# Altium footprint library Dip Switch.PcbLib: 39 footprints (part 2 of 3)
Each footprint in its own frame and in the unit in brackets; x right, y up, seen from the top. Pads: shape width x height; smd on the part's side, far side on the other; paste and mask are expansions set on the pad; w line width, h text height; cw(c..) or ccw(c..) is an arc to the next point about the centre after c.
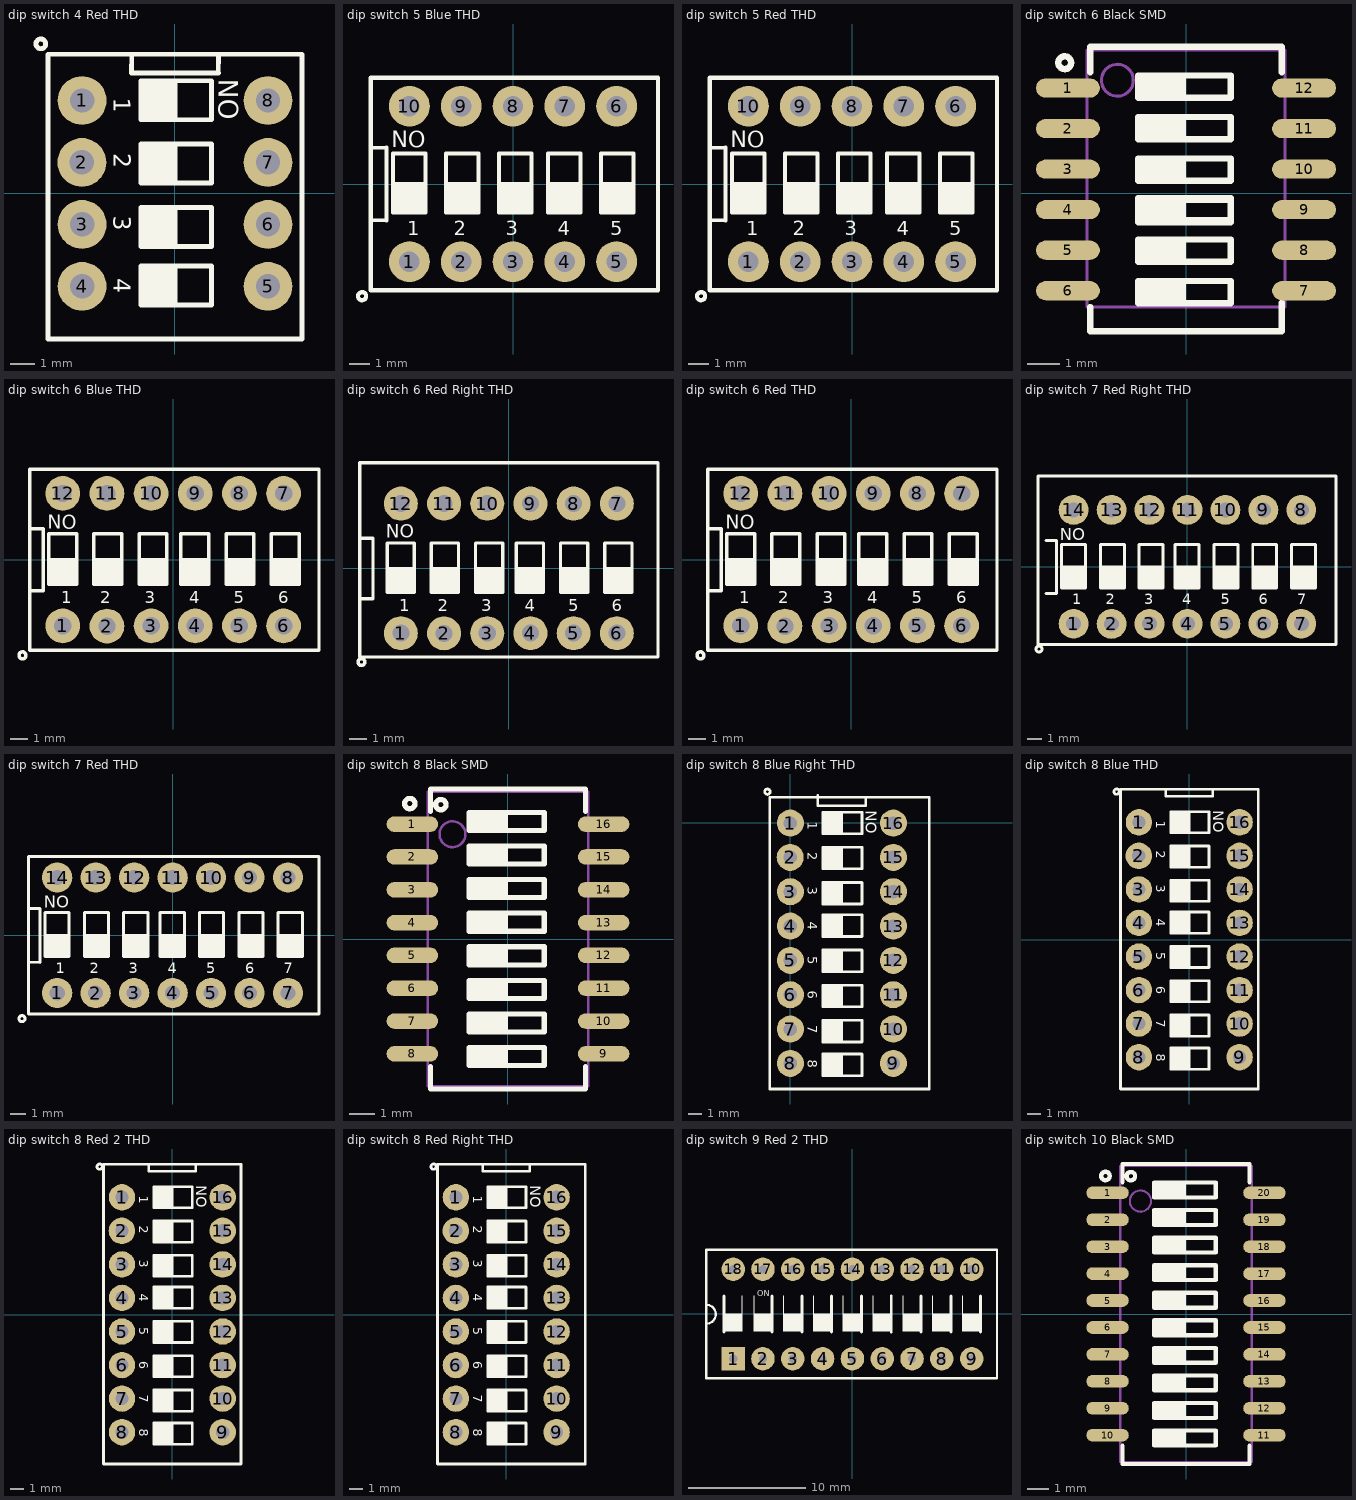
[diagram p1: the footprints below, top view; thin cyan lines are the x and y axes]

## dip switch 4 Red THD [mm]
height 6.5
pads (8):
  round 2 / inner round 1.4 / far side round 2 hole 1: 1(-3.805,3.81) 2(-3.815,1.27) 3(-3.805,-1.27) 4(-3.805,-3.81) 5(3.815,-3.81) 6(3.815,-1.27) 7(3.815,1.27) 8(3.815,3.81)
Top Overlay:
  circle w0.2: c-5.5,6.13 r0.2
  rectangle: -1.4,3.02 0.1,4.62
  rectangle: -1.4,0.42 0.1,2.02
  rectangle: -1.4,-2.18 0.1,-0.58
  rectangle: -1.4,-4.58 0.1,-2.98
  lines w0.2: -1.782,4.942 -1.773,5.656 ; -1.773,4.942 1.783,4.942 ; 1.774,4.942 1.783,5.656 ; -5.207,-5.969 5.212,-5.969 5.212,5.704 -5.207,5.704 -5.207,-5.969 ; -1.4,-4.58 -1.4,-2.98 1.5,-2.98 1.5,-4.58 -1.4,-4.58 ; -1.4,-2.18 -1.4,-0.58 1.5,-0.58 1.5,-2.18 -1.4,-2.18 ; -1.4,0.42 -1.4,2.02 1.5,2.02 1.5,0.42 -1.4,0.42 ; -1.4,3.02 -1.4,4.62 1.5,4.62 1.5,3.02 -1.4,3.02
  text "ON" at 2.6,3.02 h0.8
  text "1" at -2.51,3.911 h0.7
  text "2" at -2.51,1.647 h0.7
  text "3" at -2.51,-0.913 h0.7
  text "4" at -2.51,-3.474 h0.7
Mechanical 1:
  circle w0.025: c3.816,3.817 r0.254
  circle w0.025: c3.816,1.277 r0.254
  circle w0.025: c3.816,-1.263 r0.254
  circle w0.025: c3.816,-3.803 r0.254
  circle w0.025: c-3.804,-3.803 r0.254
  circle w0.025: c-3.804,-1.263 r0.254
  circle w0.025: c-3.814,1.277 r0.254
  circle w0.025: c-3.804,3.817 r0.254
3D body: height 6.35, standoff 0.25, extent -1.441,0.515 -0.73,2.039
3D body: height 5.08, standoff 0.25, extent -0.73,0.515 1.449,2.039
3D body: height 5.59, standoff 0, extent -1.441,-0.501 1.449,0.515
3D body: height 5.59, standoff 0, extent -1.441,-3.041 1.449,-2.025
3D body: height 5.59, standoff 0, extent -1.441,2.039 1.449,3.055
3D body: height 5.59, standoff 0, extent -1.441,4.579 1.449,5.29
3D body: height 6.35, standoff 0.25, extent -1.441,-4.565 -0.73,-3.041
3D body: height 5.08, standoff 0.25, extent -0.73,-4.565 1.449,-3.041
3D body: height 6.35, standoff 0.25, extent -1.441,-2.025 -0.73,-0.501
3D body: height 5.08, standoff 0.25, extent -0.73,-2.025 1.449,-0.501
3D body: height 5.08, standoff 0.25, extent -0.73,3.055 1.449,4.579
3D body: height 5.59, standoff 0, extent -4.947,-5.835 4.959,5.798
3D body: height 3.81, standoff 0, extent -1.904,5.29 1.906,5.798
3D body: height 0.76, standoff 0, extent -4.057,-4.057 -3.55,-3.55
3D body: height 0.76, standoff 0, extent -4.057,-1.517 -3.55,-1.01
3D body: height 0.76, standoff 0, extent -4.067,1.023 -3.56,1.53
3D body: height 0.76, standoff 0, extent -4.057,3.563 -3.55,4.07
3D body: height 0.76, standoff 0, extent 3.563,-4.057 4.07,-3.55
3D body: height 0.76, standoff 0, extent 3.563,-1.517 4.07,-1.01
3D body: height 0.76, standoff 0, extent 3.563,1.023 4.07,1.53
3D body: height 0.76, standoff 0, extent 3.563,3.563 4.07,4.07
3D body: height 6.35, standoff 0.25, extent -1.441,3.055 -0.73,4.579
3D body: height 0.25, standoff 0.05, extent -4.947,-5.835 4.959,5.798

## dip switch 5 Blue THD [mm]
height 6.5
pads (10):
  round 2 / inner round 1.4 / far side round 2 hole 1: 1(-5.08,-3.805) 2(-2.54,-3.815) 3(0,-3.805) 4(2.54,-3.805) 5(5.08,-3.805) 6(5.08,3.815) 7(2.54,3.815) 8(0,3.815) 9(-2.54,3.815) 10(-5.08,3.815)
Top Overlay:
  circle w0.2: c-7.4,-5.5 r0.2
  region: -4.29,-1.4 -4.29,0.1 -5.89,0.1 -5.89,-1.4
  region: -1.69,-1.4 -1.69,0.1 -3.29,0.1 -3.29,-1.4
  region: 0.91,-1.4 0.91,0.1 -0.69,0.1 -0.69,-1.4
  region: 3.31,-1.4 3.31,0.1 1.71,0.1 1.71,-1.4
  region: 5.91,-1.4 5.91,0.1 4.31,0.1 4.31,-1.4
  lines w0.2: -6.926,-1.773 -6.212,-1.782 ; -6.926,1.783 -6.212,1.774 ; -6.212,-1.773 -6.212,1.783 ; -6.974,-5.207 -6.974,5.212 7.108,5.212 7.108,-5.207 -6.974,-5.207 ; -5.89,-1.4 -4.29,-1.4 -4.29,1.5 -5.89,1.5 -5.89,-1.4 ; -3.29,-1.4 -1.69,-1.4 -1.69,1.5 -3.29,1.5 -3.29,-1.4 ; -0.69,-1.4 0.91,-1.4 0.91,1.5 -0.69,1.5 -0.69,-1.4 ; 1.71,-1.4 3.31,-1.4 3.31,1.5 1.71,1.5 1.71,-1.4 ; 4.31,-1.4 5.91,-1.4 5.91,1.5 4.31,1.5 4.31,-1.4
  text "ON" at -4.29,2.6 h0.8
  text "1" at -5.181,-2.51 h0.7
  text "2" at -2.917,-2.51 h0.7
  text "3" at -0.357,-2.51 h0.7
  text "4" at 2.204,-2.51 h0.7
  text "5" at 4.764,-2.51 h0.7
3D body "User Library-DIP-10.step": height 7, standoff -3.7, extent -6.849,-5.077 6.851,4.823

## dip switch 5 Red THD [mm]
height 6.5
pads (10):
  round 2 / inner round 1.4 / far side round 2 hole 1: 1(-5.08,-3.805) 2(-2.54,-3.815) 3(0,-3.805) 4(2.54,-3.805) 5(5.08,-3.805) 6(5.08,3.815) 7(2.54,3.815) 8(0,3.815) 9(-2.54,3.815) 10(-5.08,3.815)
Top Overlay:
  circle w0.2: c-7.4,-5.5 r0.2
  region: -4.29,-1.4 -4.29,0.1 -5.89,0.1 -5.89,-1.4
  region: -1.69,-1.4 -1.69,0.1 -3.29,0.1 -3.29,-1.4
  region: 0.91,-1.4 0.91,0.1 -0.69,0.1 -0.69,-1.4
  region: 3.31,-1.4 3.31,0.1 1.71,0.1 1.71,-1.4
  region: 5.91,-1.4 5.91,0.1 4.31,0.1 4.31,-1.4
  lines w0.2: -6.926,-1.773 -6.212,-1.782 ; -6.926,1.783 -6.212,1.774 ; -6.212,-1.773 -6.212,1.783 ; -6.974,-5.207 -6.974,5.212 7.108,5.212 7.108,-5.207 -6.974,-5.207 ; -5.89,-1.4 -4.29,-1.4 -4.29,1.5 -5.89,1.5 -5.89,-1.4 ; -3.29,-1.4 -1.69,-1.4 -1.69,1.5 -3.29,1.5 -3.29,-1.4 ; -0.69,-1.4 0.91,-1.4 0.91,1.5 -0.69,1.5 -0.69,-1.4 ; 1.71,-1.4 3.31,-1.4 3.31,1.5 1.71,1.5 1.71,-1.4 ; 4.31,-1.4 5.91,-1.4 5.91,1.5 4.31,1.5 4.31,-1.4
  text "ON" at -4.29,2.6 h0.8
  text "1" at -5.181,-2.51 h0.7
  text "2" at -2.917,-2.51 h0.7
  text "3" at -0.357,-2.51 h0.7
  text "4" at 2.204,-2.51 h0.7
  text "5" at 4.764,-2.51 h0.7
3D body "User Library-DS1040-05 (DIP_switch).step": height 6.8, standoff -3.85, extent -7.084,-4.954 7.076,4.947

## dip switch 6 Black SMD [mm] "SWITCH DIP 6POS, SMD, 1.27mm, 6.1X6.2mm , TDA series"
height 2.3
pads (12):
  oval 2x0.6 smd: 1(-3.7,3.302) 2(-3.7,2.032) 3(-3.7,0.762) 4(-3.7,-0.508) 5(-3.7,-1.778) 6(-3.7,-3.048) 7(3.7,-3.048) 8(3.7,-1.778) 9(3.7,-0.508) 10(3.7,0.762) 11(3.7,2.032) 12(3.7,3.302)
Top Overlay:
  circle w0.2: c-3.8,4.097 r0.2
  rectangle: -1.5,-3.429 0,-2.743
  rectangle: -1.5,-2.159 0,-1.443
  rectangle: -1.5,-0.743 0,-0.143
  rectangle: -1.5,-0.803 0,-0.203
  rectangle: -1.5,0.381 0,1.097
  rectangle: -1.5,1.778 0,2.397
  rectangle: -1.5,3.048 0,3.697
  lines w0.2: -3,-3.556 -3,-4.318 3,-4.318 3,-3.429 ; -3,3.797 -3,4.597 3,4.597 3,3.797 ; -1.5,-3.443 -1.5,-2.743 1.4,-2.743 1.4,-3.443 -1.5,-3.443 ; -1.5,-2.143 -1.5,-1.443 1.4,-1.443 1.4,-2.143 -1.5,-2.143 ; -1.5,-0.903 -1.5,-0.203 1.4,-0.203 1.4,-0.903 -1.5,-0.903 ; -1.5,-0.843 -1.5,-0.143 1.4,-0.143 1.4,-0.843 -1.5,-0.843 ; -1.5,0.397 -1.5,1.097 1.4,1.097 1.4,0.397 -1.5,0.397 ; -1.5,1.697 -1.5,2.397 1.4,2.397 1.4,1.697 -1.5,1.697 ; -1.5,2.997 -1.5,3.697 1.4,3.697 1.4,2.997 -1.5,2.997
Mechanical 13:
  circle w0.1: c-2.15,3.547 r0.5
  lines w0.1: -3.1,-3.556 -3.1,4.497 3.1,4.497 3.1,-3.556 -3.1,-3.556
3D body "User Library-DHN-06F.STEP": height 1.6, standoff 0, extent -3.35,-4.323 3.35,4.577

## dip switch 6 Blue THD [mm]
height 6.5
pads (12):
  round 2 / inner round 1.4 / far side round 2 hole 1: 1(-6.35,-3.805) 2(-3.81,-3.815) 3(-1.27,-3.805) 4(1.27,-3.805) 5(3.81,-3.805) 6(6.35,-3.805) 7(6.35,3.815) 8(3.81,3.815) 9(1.27,3.815) 10(-1.27,3.815) 11(-3.81,3.815) 12(-6.35,3.815)
Top Overlay:
  circle w0.2: c-8.67,-5.5 r0.2
  region: -5.56,-1.4 -5.56,0.1 -7.16,0.1 -7.16,-1.4
  region: -2.96,-1.4 -2.96,0.1 -4.56,0.1 -4.56,-1.4
  region: -0.36,-1.4 -0.36,0.1 -1.96,0.1 -1.96,-1.4
  region: 2.04,-1.4 2.04,0.1 0.44,0.1 0.44,-1.4
  region: 4.64,-1.4 4.64,0.1 3.04,0.1 3.04,-1.4
  region: 7.24,-1.4 7.24,0.1 5.64,0.1 5.64,-1.4
  lines w0.2: -8.196,-1.773 -7.482,-1.782 ; -8.196,1.783 -7.482,1.774 ; -7.482,-1.773 -7.482,1.783 ; -8.244,-5.207 -8.244,5.212 8.389,5.212 8.389,-5.207 -8.244,-5.207 ; -7.16,-1.4 -5.56,-1.4 -5.56,1.5 -7.16,1.5 -7.16,-1.4 ; -4.56,-1.4 -2.96,-1.4 -2.96,1.5 -4.56,1.5 -4.56,-1.4 ; -1.96,-1.4 -0.36,-1.4 -0.36,1.5 -1.96,1.5 -1.96,-1.4 ; 0.44,-1.4 2.04,-1.4 2.04,1.5 0.44,1.5 0.44,-1.4 ; 3.04,-1.4 4.64,-1.4 4.64,1.5 3.04,1.5 3.04,-1.4 ; 5.64,-1.4 7.24,-1.4 7.24,1.5 5.64,1.5 5.64,-1.4
  text "ON" at -5.56,2.6 h0.8
  text "1" at -6.451,-2.51 h0.7
  text "2" at -4.187,-2.51 h0.7
  text "3" at -1.627,-2.51 h0.7
  text "4" at 0.934,-2.51 h0.7
  text "5" at 3.494,-2.51 h0.7
  text "6" at 6.055,-2.51 h0.7
3D body "User Library-106S.STEP": height 6.97, standoff -1.89, extent -8.381,-4.815 8.319,4.885

## dip switch 6 Red Right THD [mm]
height 6.5
pads (12):
  round 2 / inner round 1.4 / far side round 2 hole 1: 1(-6.35,-3.805) 2(-3.81,-3.815) 3(-1.27,-3.805) 4(1.27,-3.805) 5(3.81,-3.805) 6(6.35,-3.805) 7(6.35,3.815) 8(3.81,3.815) 9(1.27,3.815) 10(-1.27,3.815) 11(-3.81,3.815) 12(-6.35,3.815)
Top Overlay:
  circle w0.2: c-8.67,-5.5 r0.2
  region: -5.56,-1.4 -5.56,0.1 -7.16,0.1 -7.16,-1.4
  region: -2.96,-1.4 -2.96,0.1 -4.56,0.1 -4.56,-1.4
  region: -0.36,-1.4 -0.36,0.1 -1.96,0.1 -1.96,-1.4
  region: 2.04,-1.4 2.04,0.1 0.44,0.1 0.44,-1.4
  region: 4.64,-1.4 4.64,0.1 3.04,0.1 3.04,-1.4
  region: 7.24,-1.4 7.24,0.1 5.64,0.1 5.64,-1.4
  lines w0.2: -8.704,-1.773 -7.99,-1.782 ; -8.704,1.783 -7.99,1.774 ; -7.99,-1.773 -7.99,1.783 ; -8.756,-5.207 -8.756,6.227 8.77,6.227 8.77,-5.207 -8.756,-5.207 ; -7.16,-1.4 -5.56,-1.4 -5.56,1.5 -7.16,1.5 -7.16,-1.4 ; -4.56,-1.4 -2.96,-1.4 -2.96,1.5 -4.56,1.5 -4.56,-1.4 ; -1.96,-1.4 -0.36,-1.4 -0.36,1.5 -1.96,1.5 -1.96,-1.4 ; 0.44,-1.4 2.04,-1.4 2.04,1.5 0.44,1.5 0.44,-1.4 ; 3.04,-1.4 4.64,-1.4 4.64,1.5 3.04,1.5 3.04,-1.4 ; 5.64,-1.4 7.24,-1.4 7.24,1.5 5.64,1.5 5.64,-1.4
  text "ON" at -5.56,2.6 h0.8
  text "1" at -6.451,-2.51 h0.7
  text "2" at -4.187,-2.51 h0.7
  text "3" at -1.627,-2.51 h0.7
  text "4" at 0.934,-2.51 h0.7
  text "5" at 3.494,-2.51 h0.7
  text "6" at 6.055,-2.51 h0.7
3D body "User Library-DIP SW 6P TH RA.step": height 7.9, standoff -3.8, extent -8.703,-4.886 8.717,6.034

## dip switch 6 Red THD [mm]
height 6.5
pads (12):
  round 2 / inner round 1.4 / far side round 2 hole 1: 1(-6.35,-3.805) 2(-3.81,-3.815) 3(-1.27,-3.805) 4(1.27,-3.805) 5(3.81,-3.805) 6(6.35,-3.805) 7(6.35,3.815) 8(3.81,3.815) 9(1.27,3.815) 10(-1.27,3.815) 11(-3.81,3.815) 12(-6.35,3.815)
Top Overlay:
  circle w0.2: c-8.67,-5.5 r0.2
  region: 7.24,-1.4 7.24,0.1 5.64,0.1 5.64,-1.4
  region: 4.64,-1.4 4.64,0.1 3.04,0.1 3.04,-1.4
  region: 2.04,-1.4 2.04,0.1 0.44,0.1 0.44,-1.4
  region: -0.36,-1.4 -0.36,0.1 -1.96,0.1 -1.96,-1.4
  region: -2.96,-1.4 -2.96,0.1 -4.56,0.1 -4.56,-1.4
  region: -5.56,-1.4 -5.56,0.1 -7.16,0.1 -7.16,-1.4
  lines w0.2: -8.196,-1.773 -7.482,-1.782 ; -8.196,1.783 -7.482,1.774 ; -7.482,-1.773 -7.482,1.783 ; -8.244,-5.207 8.389,-5.207 8.389,5.212 -8.244,5.212 -8.244,-5.207 ; -7.16,-1.4 -7.16,1.5 -5.56,1.5 -5.56,-1.4 -7.16,-1.4 ; -4.56,-1.4 -4.56,1.5 -2.96,1.5 -2.96,-1.4 -4.56,-1.4 ; -1.96,-1.4 -1.96,1.5 -0.36,1.5 -0.36,-1.4 -1.96,-1.4 ; 0.44,-1.4 0.44,1.5 2.04,1.5 2.04,-1.4 0.44,-1.4 ; 3.04,-1.4 3.04,1.5 4.64,1.5 4.64,-1.4 3.04,-1.4 ; 5.64,-1.4 5.64,1.5 7.24,1.5 7.24,-1.4 5.64,-1.4
  text "6" at 6.055,-2.51 h0.7
  text "5" at 3.494,-2.51 h0.7
  text "4" at 0.934,-2.51 h0.7
  text "3" at -1.627,-2.51 h0.7
  text "2" at -4.187,-2.51 h0.7
  text "1" at -6.451,-2.51 h0.7
  text "ON" at -5.56,2.6 h0.8
3D body "User Library-DS1040-06 (DIP_switch).step": height 6.8, standoff -3.85, extent -8.343,-4.955 8.357,4.945

## dip switch 7 Red Right THD [mm]
height 6.5
pads (14):
  round 2 / inner round 1.4 / far side round 2 hole 1: 1(-7.62,-3.805) 2(-5.08,-3.815) 3(-2.54,-3.805) 4(0,-3.805) 5(2.54,-3.805) 6(5.08,-3.805) 7(7.62,-3.805) 8(7.62,3.815) 9(5.08,3.815) 10(2.54,3.815) 11(0,3.815) 12(-2.54,3.815) 13(-5.08,3.815) 14(-7.62,3.815)
Top Overlay:
  circle w0.2: c-9.94,-5.5 r0.2
  region: -6.83,-1.4 -6.83,0.1 -8.43,0.1 -8.43,-1.4
  region: -4.23,-1.4 -4.23,0.1 -5.83,0.1 -5.83,-1.4
  region: -1.63,-1.4 -1.63,0.1 -3.23,0.1 -3.23,-1.4
  region: 0.77,-1.4 0.77,0.1 -0.83,0.1 -0.83,-1.4
  region: 3.37,-1.4 3.37,0.1 1.77,0.1 1.77,-1.4
  region: 5.97,-1.4 5.97,0.1 4.37,0.1 4.37,-1.4
  region: 8.57,-1.4 8.57,0.1 6.97,0.1 6.97,-1.4
  lines w0.2: -9.466,-1.773 -8.752,-1.782 ; -9.466,1.783 -8.752,1.774 ; -8.752,-1.773 -8.752,1.783 ; -9.996,-5.207 -9.996,6.088 9.943,6.088 9.943,-5.207 -9.996,-5.207 ; -8.43,-1.4 -6.83,-1.4 -6.83,1.5 -8.43,1.5 -8.43,-1.4 ; -5.83,-1.4 -4.23,-1.4 -4.23,1.5 -5.83,1.5 -5.83,-1.4 ; -3.23,-1.4 -1.63,-1.4 -1.63,1.5 -3.23,1.5 -3.23,-1.4 ; -0.83,-1.4 0.77,-1.4 0.77,1.5 -0.83,1.5 -0.83,-1.4 ; 1.77,-1.4 3.37,-1.4 3.37,1.5 1.77,1.5 1.77,-1.4 ; 4.37,-1.4 5.97,-1.4 5.97,1.5 4.37,1.5 4.37,-1.4 ; 6.97,-1.4 8.57,-1.4 8.57,1.5 6.97,1.5 6.97,-1.4
  text "ON" at -6.83,2.6 h0.8
  text "1" at -7.721,-2.51 h0.7
  text "2" at -5.457,-2.51 h0.7
  text "3" at -2.897,-2.51 h0.7
  text "4" at -0.336,-2.51 h0.7
  text "5" at 2.224,-2.51 h0.7
  text "6" at 4.785,-2.51 h0.7
  text "7" at 7.345,-2.51 h0.7
3D body "User Library-DIP SW 7P TH RA.step": height 7.9, standoff -3.8, extent -9.943,-4.897 10.017,6.022

## dip switch 7 Red THD [mm]
height 6.5
pads (14):
  round 2 / inner round 1.4 / far side round 2 hole 1: 1(-7.62,-3.805) 2(-5.08,-3.815) 3(-2.54,-3.805) 4(0,-3.805) 5(2.54,-3.805) 6(5.08,-3.805) 7(7.62,-3.805) 8(7.62,3.815) 9(5.08,3.815) 10(2.54,3.815) 11(0,3.815) 12(-2.54,3.815) 13(-5.08,3.815) 14(-7.62,3.815)
Top Overlay:
  circle w0.2: c-9.94,-5.5 r0.2
  region: -6.83,-1.4 -6.83,0.1 -8.43,0.1 -8.43,-1.4
  region: -4.23,-1.4 -4.23,0.1 -5.83,0.1 -5.83,-1.4
  region: -1.63,-1.4 -1.63,0.1 -3.23,0.1 -3.23,-1.4
  region: 0.77,-1.4 0.77,0.1 -0.83,0.1 -0.83,-1.4
  region: 3.37,-1.4 3.37,0.1 1.77,0.1 1.77,-1.4
  region: 5.97,-1.4 5.97,0.1 4.37,0.1 4.37,-1.4
  region: 8.57,-1.4 8.57,0.1 6.97,0.1 6.97,-1.4
  lines w0.2: -9.466,-1.773 -8.752,-1.782 ; -9.466,1.783 -8.752,1.774 ; -8.752,-1.773 -8.752,1.783 ; -9.514,-5.207 -9.514,5.212 9.663,5.212 9.663,-5.207 -9.514,-5.207 ; -8.43,-1.4 -6.83,-1.4 -6.83,1.5 -8.43,1.5 -8.43,-1.4 ; -5.83,-1.4 -4.23,-1.4 -4.23,1.5 -5.83,1.5 -5.83,-1.4 ; -3.23,-1.4 -1.63,-1.4 -1.63,1.5 -3.23,1.5 -3.23,-1.4 ; -0.83,-1.4 0.77,-1.4 0.77,1.5 -0.83,1.5 -0.83,-1.4 ; 1.77,-1.4 3.37,-1.4 3.37,1.5 1.77,1.5 1.77,-1.4 ; 4.37,-1.4 5.97,-1.4 5.97,1.5 4.37,1.5 4.37,-1.4 ; 6.97,-1.4 8.57,-1.4 8.57,1.5 6.97,1.5 6.97,-1.4
  text "ON" at -6.83,2.6 h0.8
  text "1" at -7.721,-2.51 h0.7
  text "2" at -5.457,-2.51 h0.7
  text "3" at -2.897,-2.51 h0.7
  text "4" at -0.336,-2.51 h0.7
  text "5" at 2.224,-2.51 h0.7
  text "6" at 4.785,-2.51 h0.7
  text "7" at 7.345,-2.51 h0.7
3D body "User Library-DS1040-07 (DIP_switch).step": height 6.8, standoff -3.85, extent -9.609,-4.954 9.631,4.946

## dip switch 8 Black SMD [mm] "SWITCH DIP 8POS, SMD, 1.27mm, 6.1X11.3mm , TDA series"
height 2.3
pads (16):
  oval 2x0.6 smd: 1(-3.7,4.445) 2(-3.7,3.175) 3(-3.7,1.905) 4(-3.7,0.635) 5(-3.7,-0.635) 6(-3.7,-1.905) 7(-3.7,-3.175) 8(-3.7,-4.445) 9(3.7,-4.445) 10(3.7,-3.175) 11(3.7,-1.905) 12(3.7,-0.635) 13(3.7,0.635) 14(3.7,1.905) 15(3.7,3.175) 16(3.7,4.445)
Top Overlay:
  circle w0.2: c-2.6,5.2 r0.2
  circle w0.2: c-3.8,5.24 r0.2
  rectangle: -1.5,4.191 0,4.9
  rectangle: -1.5,2.921 0,3.6
  rectangle: -1.5,1.7 0,2.3
  rectangle: -1.5,0.254 0,1
  rectangle: -1.5,-1.016 0,-0.3
  rectangle: -1.5,-2.286 0,-1.6
  rectangle: -1.5,-3.556 0,-2.9
  rectangle: -1.5,-4.826 0,-4.2
  lines w0.2: -3,-4.94 -3,-5.805 3,-5.805 3,-4.94 ; -3,4.94 -3,5.805 3,5.805 3,4.94 ; -1.5,-4.9 1.4,-4.9 1.4,-4.2 -1.5,-4.2 -1.5,-4.9 ; -1.5,-3.6 1.4,-3.6 1.4,-2.9 -1.5,-2.9 -1.5,-3.6 ; -1.5,-2.3 1.4,-2.3 1.4,-1.6 -1.5,-1.6 -1.5,-2.3 ; -1.5,-1 1.4,-1 1.4,-0.3 -1.5,-0.3 -1.5,-1 ; -1.5,0.3 1.4,0.3 1.4,1 -1.5,1 -1.5,0.3 ; -1.5,1.6 1.4,1.6 1.4,2.3 -1.5,2.3 -1.5,1.6 ; -1.5,2.9 1.4,2.9 1.4,3.6 -1.5,3.6 -1.5,2.9 ; -1.5,4.2 1.4,4.2 1.4,4.9 -1.5,4.9 -1.5,4.2
Mechanical 13:
  circle w0.1: c-2.15,4.055 r0.5
  lines w0.1: -3.1,-5.705 3.1,-5.705 3.1,5.705 -3.1,5.705 -3.1,-5.705
3D body "218-8polesLP.STP": height 2.57, standoff -0.05, extent -4.22,-5.665 4.22,5.665

## dip switch 8 Blue Right THD [mm]
height 6.5
pads (16):
  round 2 / inner round 1.4 / far side round 2 hole 1: 1(0.011,-0.011) 2(0.001,-2.551) 3(0.011,-5.091) 4(0.011,-7.631) 5(0.011,-10.171) 6(0.011,-12.711) 7(0.011,-15.251) 8(0.011,-17.791) 9(7.631,-17.791) 10(7.631,-15.251) 11(7.631,-12.711) 12(7.631,-10.171) 13(7.631,-7.631) 14(7.631,-5.091) 15(7.631,-2.551) 16(7.631,-0.011)
Top Overlay:
  circle w0.2: c-1.684,2.309 r0.2
  rectangle: 2.416,-0.801 3.916,0.799
  rectangle: 2.416,-3.401 3.916,-1.801
  rectangle: 2.416,-6.001 3.916,-4.401
  rectangle: 2.416,-8.401 3.916,-6.801
  rectangle: 2.416,-11.001 3.916,-9.401
  rectangle: 2.416,-13.601 3.916,-12.001
  rectangle: 2.416,-16.201 3.916,-14.601
  rectangle: 2.416,-18.701 3.916,-17.101
  lines w0.2: 2.043,2.032 2.043,1.27 5.599,1.27 5.599,1.905 ; -1.524,-19.685 10.287,-19.685 10.287,1.905 -1.524,1.905 -1.524,-19.685 ; 2.416,-18.701 2.416,-17.101 5.316,-17.101 5.316,-18.701 2.416,-18.701 ; 2.416,-16.201 2.416,-14.601 5.316,-14.601 5.316,-16.201 2.416,-16.201 ; 2.416,-13.601 2.416,-12.001 5.316,-12.001 5.316,-13.601 2.416,-13.601 ; 2.416,-11.001 2.416,-9.401 5.316,-9.401 5.316,-11.001 2.416,-11.001 ; 2.416,-8.401 2.416,-6.801 5.316,-6.801 5.316,-8.401 2.416,-8.401 ; 2.416,-6.001 2.416,-4.401 5.316,-4.401 5.316,-6.001 2.416,-6.001 ; 2.416,-3.401 2.416,-1.801 5.316,-1.801 5.316,-3.401 2.416,-3.401 ; 2.416,-0.801 2.416,0.799 5.316,0.799 5.316,-0.801 2.416,-0.801
  text "ON" at 6.416,-0.801 h0.8
  text "1" at 1.306,0.091 h0.7
  text "2" at 1.306,-2.174 h0.7
  text "3" at 1.306,-4.734 h0.7
  text "4" at 1.306,-7.295 h0.7
  text "5" at 1.306,-9.855 h0.7
  text "6" at 1.306,-12.416 h0.7
  text "7" at 1.306,-14.976 h0.7
  text "8" at 1.306,-17.537 h0.7
3D body "User Library-Dip_Switch_Piano_8ways.STEP": height 9.2, standoff -3, extent -1.397,-19.513 10.203,1.987

## dip switch 8 Blue THD [mm] "SWITCH DIP 8POS, THD, 2.54mm,"
height 6.5
pads (16):
  round 2 / inner round 1.4 / far side round 2 hole 1: 1(-3.81,8.897) 2(-3.82,6.357) 3(-3.81,3.817) 4(-3.81,1.277) 5(-3.81,-1.263) 6(-3.81,-3.803) 7(-3.81,-6.343) 8(-3.81,-8.883) 9(3.81,-8.883) 10(3.81,-6.343) 11(3.81,-3.803) 12(3.81,-1.263) 13(3.81,1.277) 14(3.81,3.817) 15(3.81,6.357) 16(3.81,8.897)
Top Overlay:
  circle w0.2: c-5.505,11.217 r0.2
  rectangle: -1.405,8.107 0.095,9.707
  rectangle: -1.405,5.507 0.095,7.107
  rectangle: -1.405,2.907 0.095,4.507
  rectangle: -1.405,0.507 0.095,2.107
  rectangle: -1.405,-2.093 0.095,-0.493
  rectangle: -1.405,-4.693 0.095,-3.093
  rectangle: -1.405,-7.293 0.095,-5.693
  rectangle: -1.405,-9.793 0.095,-8.193
  lines w0.2: -1.778,11.378 -1.778,10.87 1.778,10.87 1.778,11.378 ; -5.212,-11.293 5.207,-11.293 5.207,11.407 -5.212,11.407 -5.212,-11.293 ; -1.405,-9.793 -1.405,-8.193 1.495,-8.193 1.495,-9.793 -1.405,-9.793 ; -1.405,-7.293 -1.405,-5.693 1.495,-5.693 1.495,-7.293 -1.405,-7.293 ; -1.405,-4.693 -1.405,-3.093 1.495,-3.093 1.495,-4.693 -1.405,-4.693 ; -1.405,-2.093 -1.405,-0.493 1.495,-0.493 1.495,-2.093 -1.405,-2.093 ; -1.405,0.507 -1.405,2.107 1.495,2.107 1.495,0.507 -1.405,0.507 ; -1.405,2.907 -1.405,4.507 1.495,4.507 1.495,2.907 -1.405,2.907 ; -1.405,5.507 -1.405,7.107 1.495,7.107 1.495,5.507 -1.405,5.507 ; -1.405,8.107 -1.405,9.707 1.495,9.707 1.495,8.107 -1.405,8.107
  text "ON" at 2.595,8.107 h0.8
  text "1" at -2.514,8.998 h0.7
  text "2" at -2.514,6.734 h0.7
  text "3" at -2.514,4.174 h0.7
  text "4" at -2.514,1.613 h0.7
  text "5" at -2.514,-0.947 h0.7
  text "6" at -2.514,-3.508 h0.7
  text "7" at -2.514,-6.068 h0.7
  text "8" at -2.514,-8.629 h0.7
3D body "SW3dPS-DIP SWITCH 8 POS CTS 206.STEP": height 8.25, standoff -3.5, extent -4.9,-11.21 4.88,11.29

## dip switch 8 Red 2 THD [mm]
height 6.5
pads (16):
  round 2 / inner round 1.4 / far side round 2 hole 1: 1(-3.805,8.89) 2(-3.815,6.35) 3(-3.805,3.81) 4(-3.805,1.27) 5(-3.805,-1.27) 6(-3.805,-3.81) 7(-3.805,-6.35) 8(-3.805,-8.89) 9(3.815,-8.89) 10(3.815,-6.35) 11(3.815,-3.81) 12(3.815,-1.27) 13(3.815,1.27) 14(3.815,3.81) 15(3.815,6.35) 16(3.815,8.89)
Top Overlay:
  circle w0.2: c-5.5,11.21 r0.2
  rectangle: -1.4,-9.8 0.1,-8.2
  rectangle: -1.4,-7.3 0.1,-5.7
  rectangle: -1.4,-4.7 0.1,-3.1
  rectangle: -1.4,-2.1 0.1,-0.5
  rectangle: -1.4,0.5 0.1,2.1
  rectangle: -1.4,2.9 0.1,4.5
  rectangle: -1.4,5.5 0.1,7.1
  rectangle: -1.4,8.1 0.1,9.7
  lines w0.2: -1.773,11.371 -1.773,10.863 1.783,10.863 1.783,11.371 ; -5.207,-11.3 -5.207,11.4 5.203,11.4 5.203,-11.3 -5.207,-11.3 ; -1.4,-9.8 1.5,-9.8 1.5,-8.2 -1.4,-8.2 -1.4,-9.8 ; -1.4,-7.3 1.5,-7.3 1.5,-5.7 -1.4,-5.7 -1.4,-7.3 ; -1.4,-4.7 1.5,-4.7 1.5,-3.1 -1.4,-3.1 -1.4,-4.7 ; -1.4,-2.1 1.5,-2.1 1.5,-0.5 -1.4,-0.5 -1.4,-2.1 ; -1.4,0.5 1.5,0.5 1.5,2.1 -1.4,2.1 -1.4,0.5 ; -1.4,2.9 1.5,2.9 1.5,4.5 -1.4,4.5 -1.4,2.9 ; -1.4,5.5 1.5,5.5 1.5,7.1 -1.4,7.1 -1.4,5.5 ; -1.4,8.1 1.5,8.1 1.5,9.7 -1.4,9.7 -1.4,8.1
  text "8" at -2.51,-8.636 h0.7
  text "7" at -2.51,-6.075 h0.7
  text "6" at -2.51,-3.515 h0.7
  text "5" at -2.51,-0.954 h0.7
  text "4" at -2.51,1.606 h0.7
  text "3" at -2.51,4.167 h0.7
  text "2" at -2.51,6.727 h0.7
  text "1" at -2.51,8.991 h0.7
  text "ON" at 2.6,8.1 h0.8
3D body "User Library-DS1040-08 (DIP_switch).step": height 6.8, standoff -3.85, extent -4.951,-10.892 4.949,10.888

## dip switch 8 Red Right THD [mm] "SWITCH DIP 8POS, THD, 2.54mm"
height 6.5
pads (16):
  round 2 / inner round 1.4 / far side round 2 hole 1: 1(-3.805,8.89) 2(-3.815,6.35) 3(-3.805,3.81) 4(-3.805,1.27) 5(-3.805,-1.27) 6(-3.805,-3.81) 7(-3.805,-6.35) 8(-3.805,-8.89) 9(3.815,-8.89) 10(3.815,-6.35) 11(3.815,-3.81) 12(3.815,-1.27) 13(3.815,1.27) 14(3.815,3.81) 15(3.815,6.35) 16(3.815,8.89)
Top Overlay:
  circle w0.2: c-5.5,11.21 r0.2
  rectangle: -1.4,-9.8 0.1,-8.2
  rectangle: -1.4,-7.3 0.1,-5.7
  rectangle: -1.4,-4.7 0.1,-3.1
  rectangle: -1.4,-2.1 0.1,-0.5
  rectangle: -1.4,0.5 0.1,2.1
  rectangle: -1.4,2.9 0.1,4.5
  rectangle: -1.4,5.5 0.1,7.1
  rectangle: -1.4,8.1 0.1,9.7
  lines w0.2: -1.773,11.371 -1.773,10.863 1.783,10.863 1.783,11.371 ; -5.207,-11.3 -5.207,11.4 5.969,11.4 5.969,-11.3 -5.207,-11.3 ; -1.4,-9.8 1.5,-9.8 1.5,-8.2 -1.4,-8.2 -1.4,-9.8 ; -1.4,-7.3 1.5,-7.3 1.5,-5.7 -1.4,-5.7 -1.4,-7.3 ; -1.4,-4.7 1.5,-4.7 1.5,-3.1 -1.4,-3.1 -1.4,-4.7 ; -1.4,-2.1 1.5,-2.1 1.5,-0.5 -1.4,-0.5 -1.4,-2.1 ; -1.4,0.5 1.5,0.5 1.5,2.1 -1.4,2.1 -1.4,0.5 ; -1.4,2.9 1.5,2.9 1.5,4.5 -1.4,4.5 -1.4,2.9 ; -1.4,5.5 1.5,5.5 1.5,7.1 -1.4,7.1 -1.4,5.5 ; -1.4,8.1 1.5,8.1 1.5,9.7 -1.4,9.7 -1.4,8.1
  text "8" at -2.51,-8.636 h0.7
  text "7" at -2.51,-6.075 h0.7
  text "6" at -2.51,-3.515 h0.7
  text "5" at -2.51,-0.954 h0.7
  text "4" at -2.51,1.606 h0.7
  text "3" at -2.51,4.167 h0.7
  text "2" at -2.51,6.727 h0.7
  text "1" at -2.51,8.991 h0.7
  text "ON" at 2.6,8.1 h0.8
3D body "User Library-DIP SW 8P TH RA.step": height 7.9, standoff -3.8, extent -4.952,-11.324 5.968,11.176

## dip switch 9 Red 2 THD [mm]
height 6.5
pads (18):
  rect 2x2 hole 0.7: 1(-10.16,-3.81)
  round 2 hole 0.7: 2(-7.62,-3.81) 3(-5.08,-3.81) 4(-2.54,-3.81) 5(0,-3.81) 6(2.54,-3.81) 7(5.08,-3.81) 8(7.62,-3.81) 9(10.16,-3.81) 10(10.16,3.81) 11(7.62,3.81) 12(5.08,3.81) 13(2.54,3.81) 14(0,3.81) 15(-2.54,3.81) 16(-5.08,3.81) 17(-7.62,3.81) 18(-10.16,3.81)
Top Overlay:
  region: 3.326,-1.5 3.326,0.025 1.77,0.025 1.77,-1.5
  region: 5.866,-1.5 5.866,0.025 4.31,0.025 4.31,-1.5
  region: -9.384,-1.5 -9.384,0.025 -10.94,0.025 -10.94,-1.5
  region: -6.834,-1.5 -6.834,0.025 -8.39,0.025 -8.39,-1.5
  region: -4.294,-1.5 -4.294,0.025 -5.85,0.025 -5.85,-1.5
  region: -1.754,-1.5 -1.754,0.025 -3.31,0.025 -3.31,-1.5
  region: 0.786,-1.5 0.786,0.025 -0.77,0.025 -0.77,-1.5
  region: 8.406,-1.5 8.406,0.025 6.85,0.025 6.85,-1.5
  region: 10.946,-1.5 10.946,0.025 9.39,0.025 9.39,-1.5
  lines w0.1: -9.4,-1.47 -9.4,1.55 ; -8.38,-1.47 -8.38,1.55 ; -5.84,-1.47 -5.84,1.55 ; -3.3,-1.47 -3.3,1.55 ; -0.76,-1.47 -0.76,1.55 ; 1.78,-1.47 1.78,1.55 ; 4.32,-1.47 4.32,1.55 ; 6.86,-1.47 6.86,1.55 ; 9.4,-1.47 9.4,1.55
  lines w0.2: -12.44,-0.818 ccw(c-12.44,-0.018) -12.44,0.783 ; -12.44,-5.461 12.319,-5.461 12.319,5.461 -12.44,5.461 -12.44,-5.461
  lines w0.25: -6.85,-1.524 -6.85,1.55 ; -4.31,-1.524 -4.31,1.55 ; -1.77,-1.524 -1.77,1.55 ; 0.77,-1.524 0.77,1.55 ; 3.31,-1.524 3.31,1.55 ; 5.85,-1.524 5.85,1.55 ; 8.39,-1.524 8.39,1.55 ; 10.93,-1.524 10.93,1.55
  lines w0.254: -10.94,-1.524 -10.94,1.55
  text "ON" at -8.128,1.524 h0.51
3D body "User Library-DS1040-09 (DIP_switch).step": height 6.8, standoff -3.85, extent -12.16,-4.947 12.16,4.953

## dip switch 10 Black SMD [mm] "SWITCH DIP 10POS, SMD, 1.27mm, 6.1X13.8mm"
height 2.3
pads (20):
  oval 2x0.6 smd: 1(-3.7,5.715) 2(-3.7,4.445) 3(-3.7,3.175) 4(-3.7,1.905) 5(-3.7,0.635) 6(-3.7,-0.635) 7(-3.7,-1.905) 8(-3.7,-3.175) 9(-3.7,-4.445) 10(-3.7,-5.715) 11(3.7,-5.715) 12(3.7,-4.445) 13(3.7,-3.175) 14(3.7,-1.905) 15(3.7,-0.635) 16(3.7,0.635) 17(3.7,1.905) 18(3.7,3.175) 19(3.7,4.445) 20(3.7,5.715)
Top Overlay:
  circle w0.2: c-2.6,6.5 r0.2
  circle w0.2: c-3.8,6.51 r0.2
  rectangle: -1.5,-6.223 0,-5.5
  rectangle: -1.5,-4.953 0,-4.2
  rectangle: -1.5,-3.556 0,-2.9
  rectangle: -1.5,-2.286 0,-1.6
  rectangle: -1.5,-1.016 0,-0.3
  rectangle: -1.5,0.254 0,1
  rectangle: -1.5,1.651 0,2.3
  rectangle: -1.5,2.921 0,3.6
  rectangle: -1.5,4.191 0,4.9
  rectangle: -1.5,5.461 0,6.2
  lines w0.2: -3,-6.21 -3,-7.075 3,-7.075 3,-6.21 ; -3,6.21 -3,7.075 3,7.075 3,6.21 ; -1.5,-6.2 -1.5,-5.5 1.4,-5.5 1.4,-6.2 -1.5,-6.2 ; -1.5,-4.9 -1.5,-4.2 1.4,-4.2 1.4,-4.9 -1.5,-4.9 ; -1.5,-3.6 -1.5,-2.9 1.4,-2.9 1.4,-3.6 -1.5,-3.6 ; -1.5,-2.3 -1.5,-1.6 1.4,-1.6 1.4,-2.3 -1.5,-2.3 ; -1.5,-1 -1.5,-0.3 1.4,-0.3 1.4,-1 -1.5,-1 ; -1.5,0.3 -1.5,1 1.4,1 1.4,0.3 -1.5,0.3 ; -1.5,1.6 -1.5,2.3 1.4,2.3 1.4,1.6 -1.5,1.6 ; -1.5,2.9 -1.5,3.6 1.4,3.6 1.4,2.9 -1.5,2.9 ; -1.5,4.2 -1.5,4.9 1.4,4.9 1.4,4.2 -1.5,4.2 ; -1.5,5.5 -1.5,6.2 1.4,6.2 1.4,5.5 -1.5,5.5
Mechanical 13:
  circle w0.1: c-2.15,5.325 r0.5
  lines w0.1: -3.1,-6.975 -3.1,6.975 3.1,6.975 3.1,-6.975 -3.1,-6.975
3D body "218-10polesLP.STP": height 2.57, standoff -0.05, extent -4.22,-6.935 4.22,6.935